# Altium footprint library surface.PcbLib: 97 footprints (part 3 of 7)
Each footprint in its own frame and in the unit in brackets; x right, y up, seen from the top. Pads: shape width x height; smd on the part's side, far side on the other; paste and mask are expansions set on the pad; w line width, h text height; cw(c..) or ccw(c..) is an arc to the next point about the centre after c.
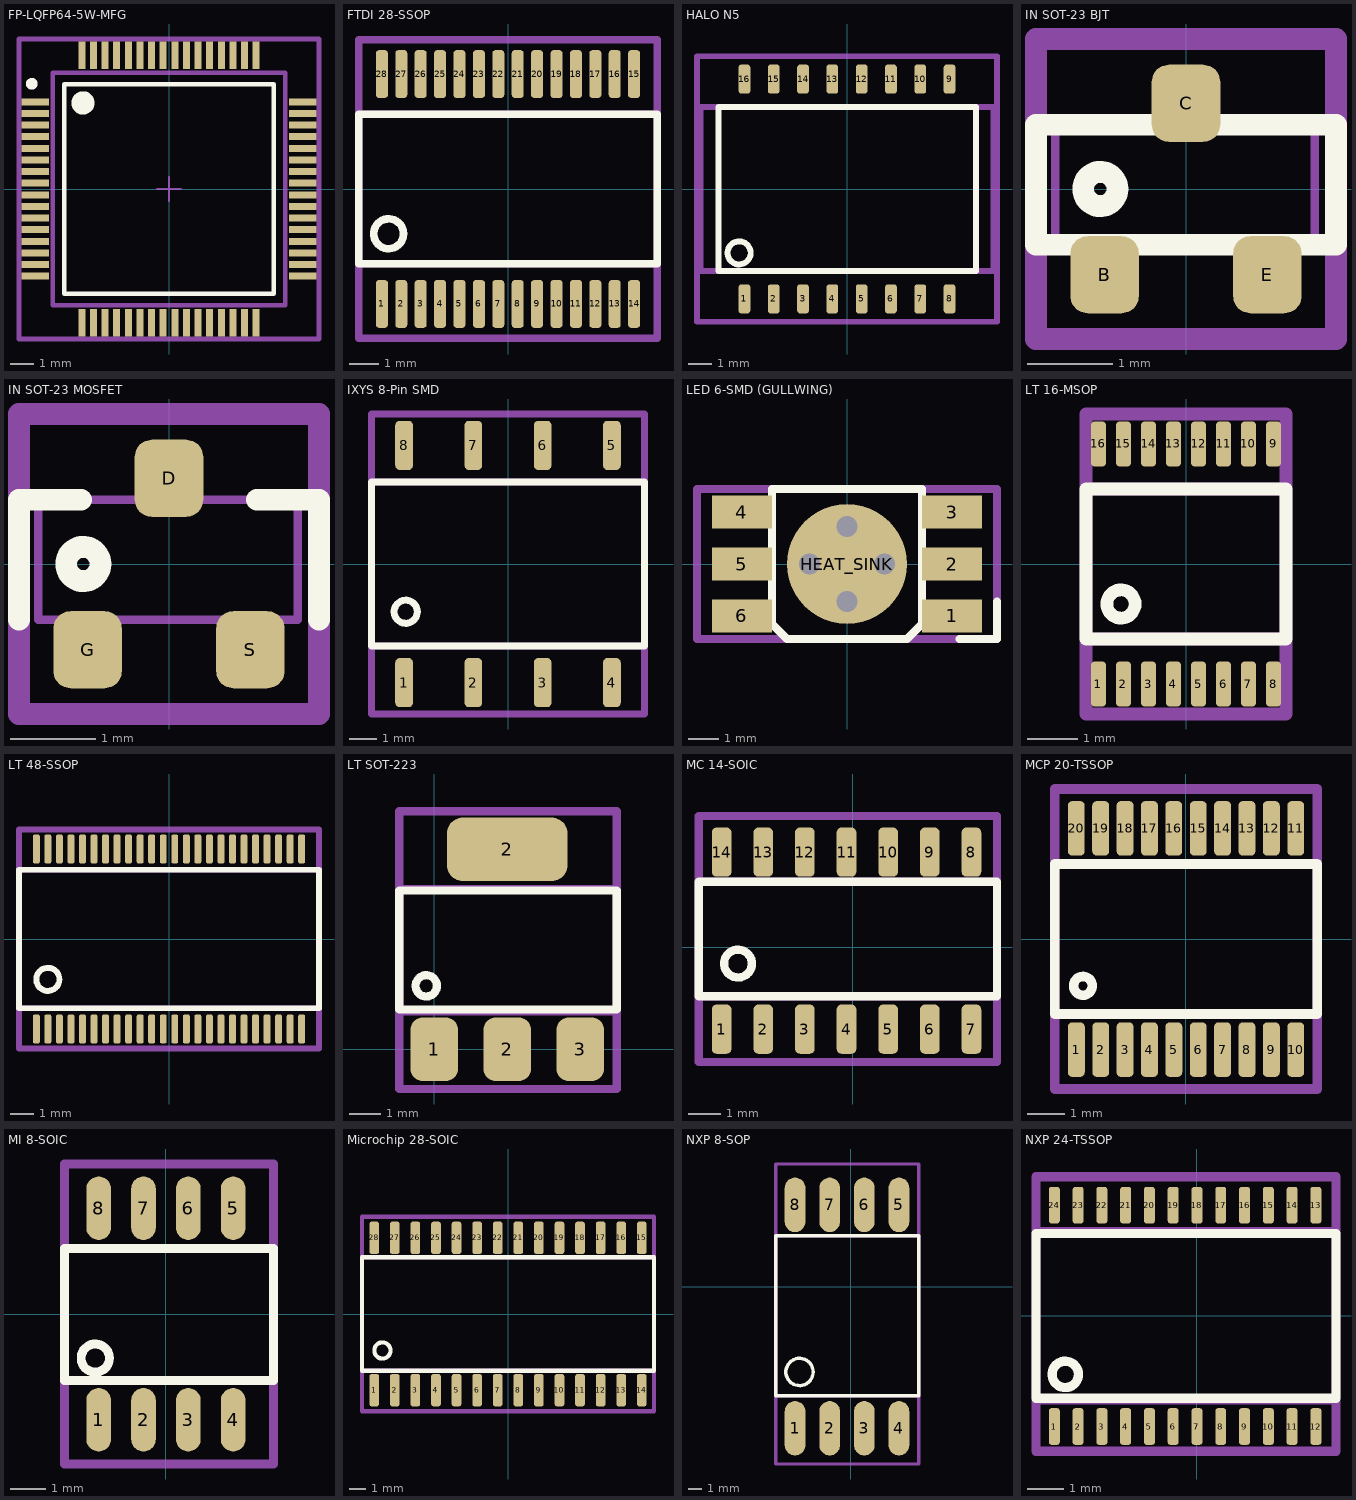
[diagram p2: the footprints below, top view; thin cyan lines are the x and y axes]

## FP-LQFP64-5W-MFG [mm]
pads (64):
  rect 1.2x0.3 smd paste+0 mask+0: 1(-5.75,3.75) 2(-5.75,3.25) 3(-5.75,2.75) 4(-5.75,2.25) 5(-5.75,1.75) 6(-5.75,1.25) 7(-5.75,0.75) 8(-5.75,0.25) 9(-5.75,-0.25) 10(-5.75,-0.75) 11(-5.75,-1.25) 12(-5.75,-1.75) 13(-5.75,-2.25) 14(-5.75,-2.75) 15(-5.75,-3.25) 16(-5.75,-3.75) 33(5.75,-3.75) 34(5.75,-3.25) 35(5.75,-2.75) 36(5.75,-2.25) 37(5.75,-1.75) 38(5.75,-1.25) 39(5.75,-0.75) 40(5.75,-0.25) 41(5.75,0.25) 42(5.75,0.75) 43(5.75,1.25) 44(5.75,1.75) 45(5.75,2.25) 46(5.75,2.75) 47(5.75,3.25) 48(5.75,3.75)
  rect 0.3x1.2 smd paste+0 mask+0: 17(-3.75,-5.75) 18(-3.25,-5.75) 19(-2.75,-5.75) 20(-2.25,-5.75) 21(-1.75,-5.75) 22(-1.25,-5.75) 23(-0.75,-5.75) 24(-0.25,-5.75) 25(0.25,-5.75) 26(0.75,-5.75) 27(1.25,-5.75) 28(1.75,-5.75) 29(2.25,-5.75) 30(2.75,-5.75) 31(3.25,-5.75) 32(3.75,-5.75) 49(3.75,5.75) 50(3.25,5.75) 51(2.75,5.75) 52(2.25,5.75) 53(1.75,5.75) 54(1.25,5.75) 55(0.75,5.75) 56(0.25,5.75) 57(-0.25,5.75) 58(-0.75,5.75) 59(-1.25,5.75) 60(-1.75,5.75) 61(-2.25,5.75) 62(-2.75,5.75) 63(-3.25,5.75) 64(-3.75,5.75)
Top Overlay:
  circle w0.5: c-3.7,3.7 r0.25
  circle w0.25: c-5.9,4.525 r0.125
  lines w0.2: -4.5,-4.5 -4.5,4.5 4.5,4.5 4.5,-4.5 -4.5,-4.5
Mechanical 5:
  lines w0.2: -6.45,-6.45 -6.45,6.45 6.45,6.45 6.45,-6.45 -6.45,-6.45
  text ".Designator" at 0,-0.001 h1
Mechanical 13:
  lines w0.2: -5,-5 -5,5 5,5 5,-5 -5,-5
Mechanical 15:
  lines w0.2: -6.45,-6.45 -6.45,6.45 6.45,6.45 6.45,-6.45 -6.45,-6.45
Mechanical 16:
  lines w0.1: -0.5,0 0.5,0 ; 0,-0.5 0,0.5
3D body "IC_STMicroelectronics_STM32F413RGT6_eec.STEP": height 0.25, standoff 0, extent -6.45,-6.45 6.45,6.45

## FTDI 28-SSOP [mm]
pads (28):
  rrect50% 0.4x1.6 smd paste+0 mask+0.051: 1(-4.225,-3.85) 2(-3.575,-3.85) 3(-2.925,-3.85) 4(-2.275,-3.85) 5(-1.625,-3.85) 6(-0.975,-3.85) 7(-0.325,-3.85) 8(0.325,-3.85) 9(0.975,-3.85) 10(1.625,-3.85) 11(2.275,-3.85) 12(2.925,-3.85) 13(3.575,-3.85) 14(4.225,-3.85) 15(4.225,3.85) 16(3.575,3.85) 17(2.925,3.85) 18(2.275,3.85) 19(1.625,3.85) 20(0.975,3.85) 21(0.325,3.85) 22(-0.325,3.85) 23(-0.975,3.85) 24(-1.625,3.85) 25(-2.275,3.85) 26(-2.925,3.85) 27(-3.575,3.85) 28(-4.225,3.85)
Top Overlay:
  circle w0.254: c-4,-1.5 r0.5
  lines w0.254: -5,-2.5 5,-2.5 5,2.5 -5,2.5 -5,-2.5
Mechanical 13:
  lines w0.254: -5,-2.5 5,-2.5 5,2.5 -5,2.5 -5,-2.5
Mechanical 15:
  lines w0.254: -5,-5 5,-5 5,5 -5,5 -5,-5
3D body "FT232RL-REEL--3DModel-STEP-56544.STEP": height 2, standoff 0, extent -5.1,-3.9 5.1,3.9

## HALO N5 [mil]
pads (16):
  rrect50% 20x50 smd: 1(-175,-187.5) 2(-125,-187.5) 3(-75,-187.5) 4(-25,-187.5) 5(25,-187.5) 6(75,-187.5) 7(125,-187.5) 8(175,-187.5) 9(175,187.5) 10(125,187.5) 11(75,187.5) 12(25,187.5) 13(-25,187.5) 14(-75,187.5) 15(-125,187.5) 16(-175,187.5)
Top Overlay:
  circle w10: c-184,-109 r19.68
  lines w10: -219,-140 -219,140 220,140 220,-140 -219,-140
Mechanical 13:
  lines w10: -250,-140 -250,140 250,140 250,-140 -250,-140
Mechanical 15:
  lines w10: -255.91,-226.38 -255.91,226.38 255.91,226.38 255.91,-226.38 -255.91,-226.38
3D body: height 19.68, standoff 0, extent 162.5,-187.5 187.5,187.5
3D body: height 19.68, standoff 0, extent 112.5,-187.5 137.5,187.5
3D body: height 19.68, standoff 0, extent 62.5,-187.5 87.5,187.5
3D body: height 19.68, standoff 0, extent 12.5,-187.5 37.5,187.5
3D body: height 19.68, standoff 0, extent -37.5,-187.5 -12.5,187.5
3D body: height 19.68, standoff 0, extent -87.5,-187.5 -62.5,187.5
3D body: height 19.68, standoff 0, extent -137.5,-187.5 -112.5,187.5
3D body: height 19.68, standoff 0, extent -187.5,-187.5 -162.5,187.5
3D body: height 250, standoff 0, extent -250,-140 250,140

## IN SOT-23 BJT [mm]
pads (3):
  rrect50% 0.8x0.9 smd: B(-0.95,-1) C(0,1) E(0.95,-1)
Top Overlay:
  circle w0.254: c-1,0 r0.2
  lines w0.254: -1.75,0.75 -1.75,0.75 ; -1.75,0.75 -1.75,-0.65 1.75,-0.65 1.75,0.75 -1.75,0.75
Mechanical 13:
  lines w0.1: -1.525,-0.65 -1.525,0.75 1.5,0.75 1.5,-0.65 -1.525,-0.65
Mechanical 15:
  lines w0.254: -1.75,-1.75 -1.75,1.75 1.75,1.75 1.75,-1.75 -1.75,-1.75
3D body "SOT-23.STEP": height 1, standoff 0, extent -1.5,-1.275 1.5,1.275

## IN SOT-23 MOSFET [mm] "NUP2105L"
pads (3):
  rrect50% 0.8x0.9 smd: D(0,1) G(-0.95,-1) S(0.95,-1)
Top Overlay:
  circle w0.254: c-1,0 r0.2
  lines w0.254: -1.75,-0.65 -1.75,0.75 ; -1.028,0.75 -1.75,0.75 ; 1.028,0.75 1.75,0.75 1.75,-0.65 ; -1.75,0.75 -1.75,0.75
Mechanical 13:
  lines w0.1: -1.525,-0.65 -1.525,0.75 1.5,0.75 1.5,-0.65 -1.525,-0.65
Mechanical 15:
  lines w0.254: -1.75,-1.75 -1.75,1.75 1.75,1.75 1.75,-1.75 -1.75,-1.75
3D body "SOT-23.STEP": height 1, standoff 0, extent -1.5,-1.275 1.5,1.275

## IXYS 8-Pin SMD [mm]
pads (8):
  rrect50% 0.65x1.8 smd: 1(-3.81,-4.35) 2(-1.27,-4.35) 3(1.27,-4.35) 4(3.81,-4.35) 5(3.81,4.35) 6(1.27,4.35) 7(-1.27,4.35) 8(-3.81,4.35)
Top Overlay:
  circle w0.254: c-3.75,-1.75 r0.424
  lines w0.254: -5,-3 5,-3 5,3 -5,3 -5,-3
Mechanical 13:
  lines w0.254: -5,-3 -5,3 5,3 5,-3 -5,-3
Mechanical 15:
  lines w0.254: -5,-5.5 -5,5.5 5,5.5 5,-5.5 -5,-5.5
3D body: height 3.3, standoff 0, extent -5,-3 5,3

## LED 6-SMD (GULLWING) [mm] "LED used in TS_21 Mule Cart TSAL"
height 1.3
pads (7):
  rect 2x1.1 smd: 1(3.5,-1.725) 2(3.5,0) 3(3.5,1.725) 4(-3.5,1.725) 5(-3.5,0) 6(-3.5,-1.725)
  round 4 smd: HEAT_SINK(0,0)
via -1.25,0 diameter 1.27 hole 0.711
via 0,-1.25 diameter 1.27 hole 0.711
via 1.25,0 diameter 1.27 hole 0.711
via 0,1.25 diameter 1.27 hole 0.711
Top Overlay:
  lines w0.254: 3.75,-2.5 5,-2.5 5,-1.25 ; -2.5,-2 -2.5,2.5 -1.75,2.5 0.75,2.5 2.5,2.5 2.5,-2 2,-2.5 -2,-2.5 -2.5,-2
Mechanical 15:
  lines w0.254: -5,-2.5 -5,2.5 5,2.5 5,-2.5 -5,-2.5

## LT 16-MSOP [mm]
pads (16):
  rrect50% 0.305x0.9 smd: 1(-1.75,-2.4) 2(-1.25,-2.4) 3(-0.75,-2.4) 4(-0.25,-2.4) 5(0.25,-2.4) 6(0.75,-2.4) 7(1.25,-2.4) 8(1.75,-2.4) 9(1.75,2.4) 10(1.25,2.4) 11(0.75,2.4) 12(0.25,2.4) 13(-0.25,2.4) 14(-0.75,2.4) 15(-1.25,2.4) 16(-1.75,2.4)
Top Overlay:
  circle w0.254: c-1.3,-0.8 r0.283
  lines w0.254: -2,-1.5 -2,1.5 2,1.5 2,-1.5 -2,-1.5
Mechanical 13:
  lines w0.254: -2,-1.5 -2,1.5 2,1.5 2,-1.5 -2,-1.5
Mechanical 15:
  lines w0.254: -2,-3 -2,3 2,3 2,-3 -2,-3
3D body "MSOP-16_MS-L.step": height 1.09, standoff 0, extent -2.07,-2.527 2.07,2.527

## LT 48-SSOP [mm]
pads (48):
  rrect50% 0.3x1.25 smd mask+0.051: 1(-5.75,-3.9) 2(-5.25,-3.9) 3(-4.75,-3.9) 4(-4.25,-3.9) 5(-3.75,-3.9) 6(-3.25,-3.9) 7(-2.75,-3.9) 8(-2.25,-3.9) 9(-1.75,-3.9) 10(-1.25,-3.9) 11(-0.75,-3.9) 12(-0.25,-3.9) 13(0.25,-3.9) 14(0.75,-3.9) 15(1.25,-3.9) 16(1.75,-3.9) 17(2.25,-3.9) 18(2.75,-3.9) 19(3.25,-3.9) 20(3.75,-3.9) 21(4.25,-3.9) 22(4.75,-3.9) 23(5.25,-3.9) 24(5.75,-3.9) 25(5.75,3.9) 26(5.25,3.9) 27(4.75,3.9) 28(4.25,3.9) 29(3.75,3.9) 30(3.25,3.9) 31(2.75,3.9) 32(2.25,3.9) 33(1.75,3.9) 34(1.25,3.9) 35(0.75,3.9) 36(0.25,3.9) 37(-0.25,3.9) 38(-0.75,3.9) 39(-1.25,3.9) 40(-1.75,3.9) 41(-2.25,3.9) 42(-2.75,3.9) 43(-3.25,3.9) 44(-3.75,3.9) 45(-4.25,3.9) 46(-4.75,3.9) 47(-5.25,3.9) 48(-5.75,3.9)
Top Overlay:
  circle w0.254: c-5.25,-1.75 r0.5
  lines w0.254: -6.5,-3 -6.5,3 6.5,3 6.5,-3 -6.5,-3
Mechanical 13:
  lines w0.254: -6.5,-3 -6.5,3 6.5,3 6.5,-3 -6.5,-3
Mechanical 15:
  lines w0.254: -6.5,-4.75 -6.5,4.75 6.5,4.75 6.5,-4.75 -6.5,-4.75
3D body "SSOP-48_G-L.step": height 2.01, standoff 0, extent -6.553,-4.102 6.553,4.102

## LT SOT-223 [mm]
pads (4):
  rrect50% 1.5x2 smd: 1(0,0) 2(2.3,0) 3(4.6,0)
  rrect50% 3.8x2 smd: 2(2.3,6.3)
Top Overlay:
  circle w0.254: c-0.25,2 r0.335
  lines w0.254: -1.1,1.25 -1.1,5 5.75,5 5.75,1.25 -1.1,1.25
Mechanical 13:
  lines w0.254: -1.1,-1.25 -1.1,7.5 5.75,7.5 5.75,-1.25 -1.1,-1.25
Mechanical 15:
  lines w0.254: -1.1,1.2 5.75,1.2 5.75,5.05 -1.1,5.05 -1.1,4.3 -1.1,1.2
3D body "SOT223-3.step": height 1.6, standoff 0, extent -0.925,-0.437 5.575,6.637

## MC 14-SOIC [mm]
pads (14):
  rrect50% 0.6x1.5 smd: 1(-4,-2.5) 2(-2.73,-2.5) 3(-1.46,-2.5) 4(-0.19,-2.5) 5(1.08,-2.5) 6(2.35,-2.5) 7(3.62,-2.5) 8(3.62,2.9) 9(2.35,2.9) 10(1.08,2.9) 11(-0.19,2.9) 12(-1.46,2.9) 13(-2.73,2.9) 14(-4,2.9)
Top Overlay:
  circle w0.254: c-3.5,-0.5 r0.424
  lines w0.254: -4.7,-1.5 -4.7,2 4.4,2 4.4,-1.5 -4.7,-1.5
Mechanical 13:
  lines w0.254: -4.7,-1.5 -4.7,2 4.4,2 4.4,-1.5 -4.7,-1.5
Mechanical 15:
  lines w0.254: -4.7,-3.5 4.4,-3.5 4.4,4 -4.7,4 -4.7,-3.5
3D body "SOIC14-N_MC.step": height 1.76, standoff 0, extent -4.521,-2.797 4.141,3.197

## MCP 20-TSSOP [mm]
pads (20):
  rrect50% 0.45x1.45 smd mask+0.05: 1(-2.925,-2.95) 2(-2.275,-2.95) 3(-1.625,-2.95) 4(-0.975,-2.95) 5(-0.325,-2.95) 6(0.325,-2.95) 7(0.975,-2.95) 8(1.625,-2.95) 9(2.275,-2.95) 10(2.925,-2.95) 11(2.925,2.95) 12(2.275,2.95) 13(1.625,2.95) 14(0.975,2.95) 15(0.325,2.95) 16(-0.325,2.95) 17(-0.975,2.95) 18(-1.625,2.95) 19(-2.275,2.95) 20(-2.925,2.95)
Top Overlay:
  circle w0.254: c-2.75,-1.25 r0.25
  lines w0.254: -3.5,-2 3.5,-2 3.5,2 -3.5,2 -3.5,-2
Mechanical 13:
  lines w0.254: -3.5,-2 3.5,-2 3.5,2 -3.5,2 -3.5,-2
Mechanical 15:
  lines w0.254: -3.5,-4 3.5,-4 3.5,4 -3.5,4 -3.5,-4
3D body "TSSOP20_MC-L.step": height 1.2, standoff 0, extent -3.302,-3.2 3.302,3.2

## MI 8-SOIC [mm]
pads (8):
  oval 0.7x1.8 smd: 1(-1.905,-3) 2(-0.635,-3) 3(0.635,-3) 4(1.905,-3) 5(1.905,3) 6(0.635,3) 7(-0.635,3) 8(-1.905,3)
Top Overlay:
  circle w0.254: c-2,-1.25 r0.4
  lines w0.254: -2.873,-1.88 3.048,-1.88 3.048,1.854 -2.873,1.854 -2.873,-1.88
Mechanical 13:
  lines w0.254: -2.873,-1.88 -2.873,1.854 3.048,1.854 3.048,-1.88 -2.873,-1.88
Mechanical 15:
  lines w0.254: -2.873,-4.25 -2.873,4.25 3.048,4.25 3.048,-4.25 -2.873,-4.25
3D body "R_8-L.step": height 1.76, standoff 0, extent -2.502,-3.099 2.502,3.099

## Microchip 28-SOIC [mm]
pads (28):
  rrect50% 0.6x2 smd: 1(-8.255,-4.7) 2(-6.985,-4.7) 3(-5.715,-4.7) 4(-4.445,-4.7) 5(-3.175,-4.7) 6(-1.905,-4.7) 7(-0.635,-4.7) 8(0.635,-4.7) 9(1.905,-4.7) 10(3.175,-4.7) 11(4.445,-4.7) 12(5.715,-4.7) 13(6.985,-4.7) 14(8.255,-4.7) 15(8.255,4.7) 16(6.985,4.7) 17(5.715,4.7) 18(4.445,4.7) 19(3.175,4.7) 20(1.905,4.7) 21(0.635,4.7) 22(-0.635,4.7) 23(-1.905,4.7) 24(-3.175,4.7) 25(-4.445,4.7) 26(-5.715,4.7) 27(-6.985,4.7) 28(-8.255,4.7)
Top Overlay:
  circle w0.254: c-7.75,-2.25 r0.5
  lines w0.254: -9,-3.5 -9,3.5 9,3.5 9,-3.5 -9,-3.5
Mechanical 13:
  lines w0.254: -9,-3.5 9,-3.5 9,3.5 -9,3.5 -9,-3.5
Mechanical 15:
  lines w0.254: -9,-6 9,-6 9,6 -9,6 -9,-6
3D body "SW3dPS-SOIC28-300.SLDPRT": height 2.65, standoff 0, extent -8.95,-5.15 8.95,5.15

## NXP 8-SOP [mm]
pads (8):
  oval 1.52x4 smd: 1(-4.08,-10.38) 2(-1.54,-10.38) 3(1,-10.38) 4(3.54,-10.38) 5(3.54,6) 6(1,6) 7(-1.54,6) 8(-4.08,6)
Top Overlay:
  circle w0.254: c-3.75,-6.25 r1
  lines w0.254: -5.5,-8 5,-8 5,3.734 -5.5,3.734 -5.5,-8
Mechanical 13:
  lines w0.254: -5.5,-8 5,-8 5,3.734 -5.5,3.734 -5.5,-8
Mechanical 15:
  lines w0.254: -5.5,-13 5,-13 5,9 -5.5,9 -5.5,-13
3D body "presssense.STEP": height 10.15, standoff 0, extent -12.97,-10.89 5.953,6.89

## NXP 24-TSSOP [mm]
pads (24):
  rrect50% 0.3x1 smd: 1(-3.9,-3.025) 2(-3.25,-3.025) 3(-2.6,-3.025) 4(-1.95,-3.025) 5(-1.3,-3.025) 6(-0.65,-3.025) 7(0,-3.025) 8(0.65,-3.025) 9(1.3,-3.025) 10(1.95,-3.025) 11(2.6,-3.025) 12(3.25,-3.025) 13(3.25,3.025) 14(2.6,3.025) 15(1.95,3.025) 16(1.3,3.025) 17(0.65,3.025) 18(0,3.025) 19(-0.65,3.025) 20(-1.3,3.025) 21(-1.95,3.025) 22(-2.6,3.025) 23(-3.25,3.025) 24(-3.9,3.025)
Top Overlay:
  circle w0.254: c-3.6,-1.6 r0.361
  lines w0.254: -4.4,-2.25 3.8,-2.25 3.8,2.25 -4.4,2.25 -4.4,-2.25
Mechanical 13:
  lines w0.254: -4.4,-2.3 3.8,-2.3 3.8,2.3 -4.4,2.3 -4.4,-2.3
Mechanical 15:
  lines w0.254: -4.4,-3.7 3.8,-3.7 3.8,3.8 -4.4,3.8 -4.4,-3.7
3D body "tssop_24.step": height 1.21, standoff -0.01, extent -4.225,-3.2 3.575,3.203